# Altium footprint library KwantLib.PcbLib: 249 footprints (part 8 of 16)
Each footprint in its own frame and in the unit in brackets; x right, y up, seen from the top. Pads: shape width x height; smd on the part's side, far side on the other; paste and mask are expansions set on the pad; w line width, h text height; cw(c..) or ccw(c..) is an arc to the next point about the centre after c.
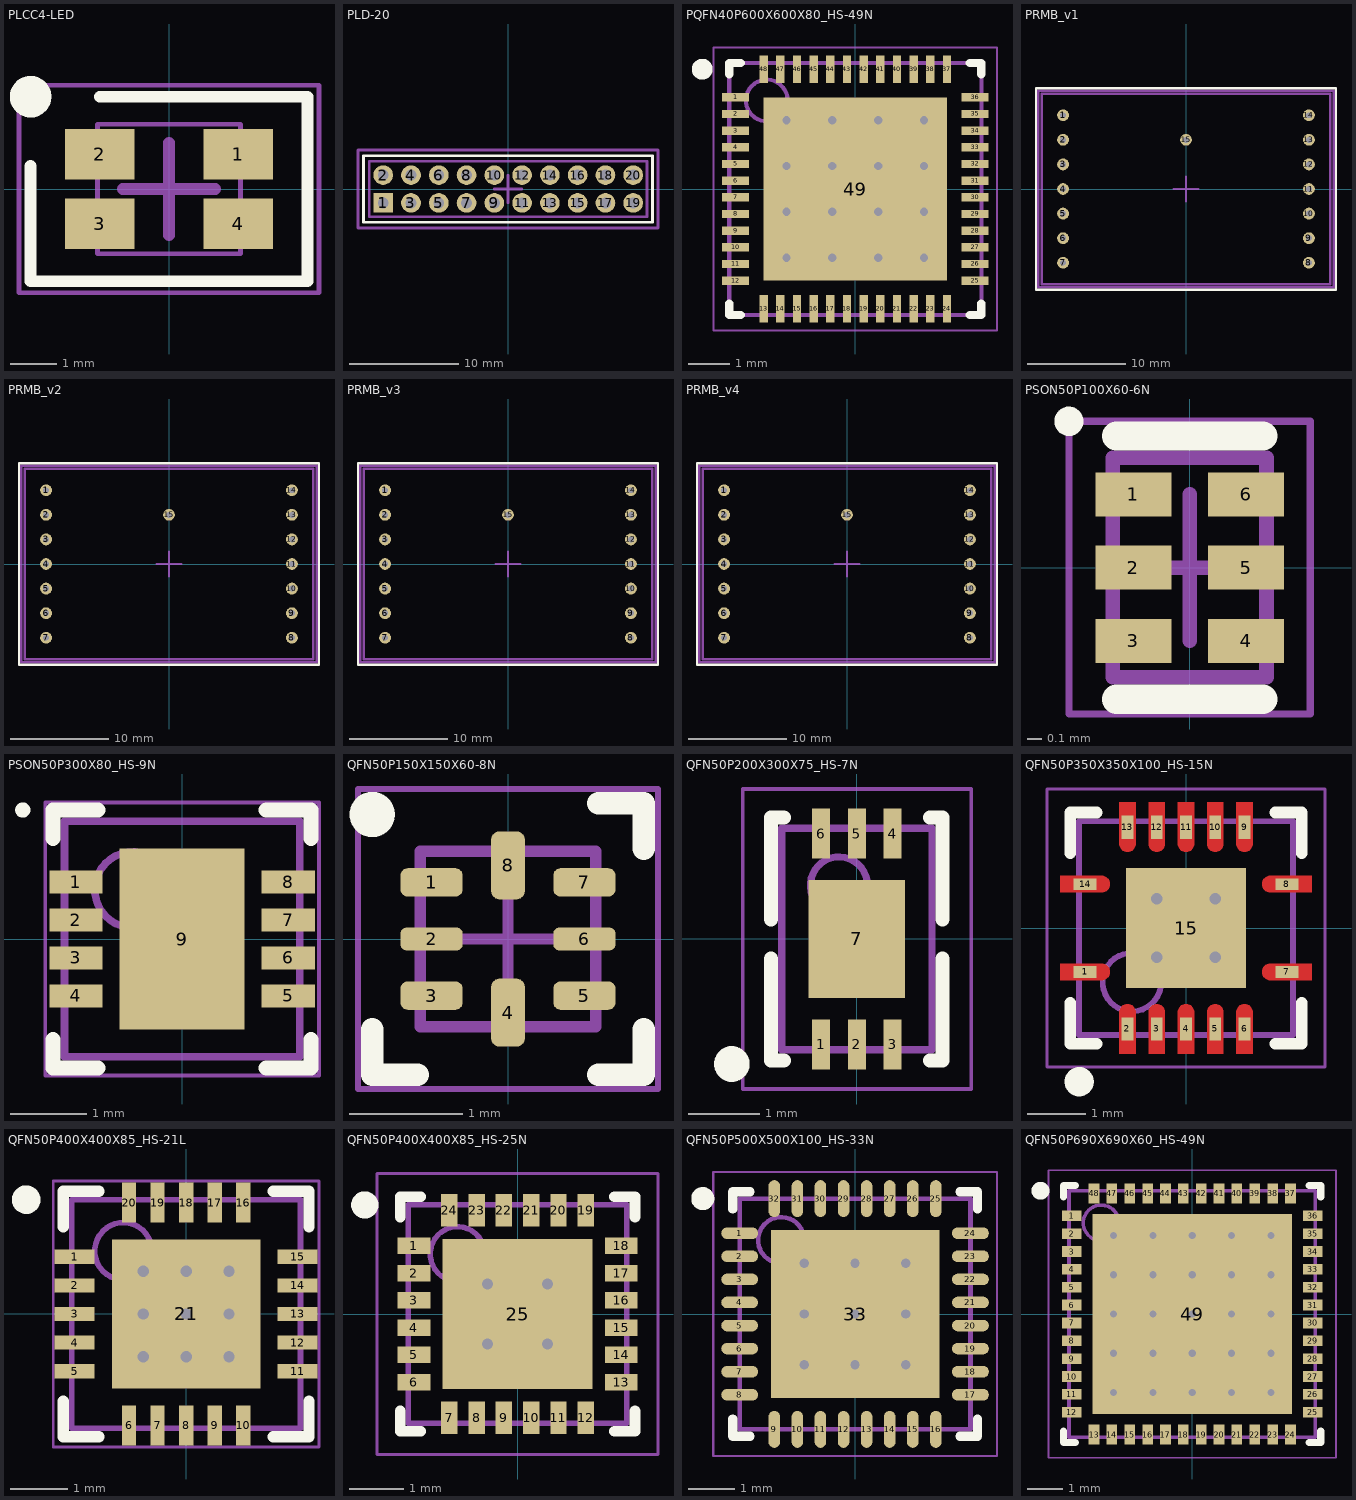
[diagram p7: the footprints below, top view; thin cyan lines are the x and y axes]

## PLCC4-LED [mm]
height 2
pads (4):
  rect 1.5x1.09 smd: 1(1.5,0.75) 2(-1.5,0.75) 3(-1.5,-0.75) 4(1.5,-0.75)
Top Overlay:
  circle w0.5: c-3,2 r0.2
  lines w0.254: -3,0.5 -3,-2 3,-2 3,2 -1.5,2
Mechanical 13:
  lines w0.1: -1.55,-1.4 1.55,-1.4 1.55,1.4 -1.55,1.4 -1.55,-1.4
Mechanical 15:
  lines w0.1: -3.25,-2.25 3.25,-2.25 3.25,2.25 -3.25,2.25 -3.25,-2.25
  lines w0.254: -1,0 1,0 ; 0,-1 0,1
3D body: height 2, standoff 0.01, extent -1.55,-1.4 1.55,1.4

## PLD-20 [mm]
height 8.5
pads (20):
  rect 1.8x1.8 hole 1: 1(-11.41,-1.27)
  round 1.8 hole 1: 2(-11.41,1.27) 3(-8.87,-1.27) 4(-8.87,1.27) 5(-6.33,-1.27) 6(-6.33,1.27) 7(-3.79,-1.27) 8(-3.79,1.27) 9(-1.25,-1.27) 10(-1.25,1.27) 11(1.29,-1.27) 12(1.29,1.27) 13(3.83,-1.27) 14(3.83,1.27) 15(6.37,-1.27) 16(6.37,1.27) 17(8.91,-1.27) 18(8.91,1.27) 19(11.45,-1.27) 20(11.45,1.27)
Top Overlay:
  lines w0.25: -13.208,-3.048 13.208,-3.048 13.208,3.048 -13.208,3.048 -13.208,-3.048
Mechanical 13:
  lines w0.25: -12.68,-2.54 12.72,-2.54 12.72,2.54 -12.68,2.54 -12.68,-2.54
Mechanical 15:
  lines w0.25: -1.25,0 1.25,0 ; 0,-1.25 0,1.25 ; -13.716,-3.556 13.716,-3.556 13.716,3.556 -13.716,3.556 -13.716,-3.556
3D body "PLD-2x10.stp": height 8.01, standoff -2.99, extent -12.68,-2.54 12.72,2.54

## PQFN40P600X600X80_HS-49N [mm] "PQFN, 48-Leads, Body 6.00x6.00mm, Pitch 0.40mm, Thermal Pad 4.40x4.40mm, IPC Medium Density"
height 0.8
pads (49):
  rect 0.65x0.2 smd paste-0.02 mask+0.07: 1(-2.875,2.2) 2(-2.875,1.8) 3(-2.875,1.4) 4(-2.875,1) 5(-2.875,0.6) 6(-2.875,0.2) 7(-2.875,-0.2) 8(-2.875,-0.6) 9(-2.875,-1) 10(-2.875,-1.4) 11(-2.875,-1.8) 12(-2.875,-2.2) 25(2.875,-2.2) 26(2.875,-1.8) 27(2.875,-1.4) 28(2.875,-1) 29(2.875,-0.6) 30(2.875,-0.2) 31(2.875,0.2) 32(2.875,0.6) 33(2.875,1) 34(2.875,1.4) 35(2.875,1.8) 36(2.875,2.2)
  rect 0.2x0.65 smd paste-0.02 mask+0.07: 13(-2.2,-2.875) 14(-1.8,-2.875) 15(-1.4,-2.875) 16(-1,-2.875) 17(-0.6,-2.875) 18(-0.2,-2.875) 19(0.2,-2.875) 20(0.6,-2.875) 21(1,-2.875) 22(1.4,-2.875) 23(1.8,-2.875) 24(2.2,-2.875) 37(2.2,2.875) 38(1.8,2.875) 39(1.4,2.875) 40(1,2.875) 41(0.6,2.875) 42(0.2,2.875) 43(-0.2,2.875) 44(-0.6,2.875) 45(-1,2.875) 46(-1.4,2.875) 47(-1.8,2.875) 48(-2.2,2.875)
  rect 4.4x4.4 smd paste-4 mask+0.07: 49(0,0)
via -1.65,1.65 diameter 0.5 hole 0.2
via -0.55,1.65 diameter 0.5 hole 0.2
via 0.55,1.65 diameter 0.5 hole 0.2
via 1.65,1.65 diameter 0.5 hole 0.2
via -1.65,0.55 diameter 0.5 hole 0.2
via -0.55,0.55 diameter 0.5 hole 0.2
via 0.55,0.55 diameter 0.5 hole 0.2
via 1.65,0.55 diameter 0.5 hole 0.2
via -1.65,-0.55 diameter 0.5 hole 0.2
via -0.55,-0.55 diameter 0.5 hole 0.2
via 0.55,-0.55 diameter 0.5 hole 0.2
via 1.65,-0.55 diameter 0.5 hole 0.2
via -1.65,-1.65 diameter 0.5 hole 0.2
via -0.55,-1.65 diameter 0.5 hole 0.2
via 0.55,-1.65 diameter 0.5 hole 0.2
via 1.65,-1.65 diameter 0.5 hole 0.2
Top Overlay:
  circle w0.25: c-3.675,2.875 r0.125
  lines w0.2: -3.025,-2.75 -3.025,-3.025 -2.75,-3.025 ; -3.025,2.75 -3.025,3.025 -2.75,3.025 ; 2.75,-3.025 3.025,-3.025 3.025,-2.75 ; 2.75,3.025 3.025,3.025 3.025,2.75
Top Paste:
  region: -2.025,-2.025 -2.025,-0.175 -0.175,-0.175 -0.175,-2.025
  region: 0.175,-2.025 0.175,-0.175 2.025,-0.175 2.025,-2.025
  region: 0.175,0.175 0.175,2.025 2.025,2.025 2.025,0.175
  region: -2.025,0.175 -2.025,2.025 -0.175,2.025 -0.175,0.175
Mechanical 13:
  circle w0.1: c-2.125,2.125 r0.5
  lines w0.1: -3.025,-3.025 -3.025,3.025 3.025,3.025 3.025,-3.025 -3.025,-3.025
Mechanical 15:
  lines w0.05: -3.4,-3.4 -3.4,3.4 3.4,3.4 3.4,-3.4 -3.4,-3.4
  lines w0.1: -0.5,0 0.5,0 ; 0,-0.5 0,0.5
3D body "PQFN40P600X600X80_HS-49N.step": height 0.8, standoff 0, extent -3.025,-3.025 3.025,3.025

## PRMB_v1 [mm] "Корпус УЗС Тестовый"
pads (15):
  round 1.2 hole 0.6: 1(-12.5,7.5) 2(-12.5,5) 3(-12.5,2.5) 4(-12.5,0) 5(-12.5,-2.5) 6(-12.5,-5) 7(-12.5,-7.5) 8(12.5,-7.5) 9(12.5,-5) 10(12.5,-2.5) 11(12.5,0) 12(12.5,2.5) 13(12.5,5) 14(12.5,7.5) 15(0,5)
Top Overlay:
  lines w0.254: -15.25,-10.25 -15.25,10.25 15.25,10.25 15.25,-10.25 -15.25,-10.25
Mechanical 13:
  lines w0.254: -14.675,-9.675 14.675,-9.675 14.675,9.675 -14.675,9.675 -14.675,-9.675
Mechanical 15:
  lines w0.254: -1.25,0 1.25,0 ; 0,-1.25 0,1.25 ; -15,-10 15,-10 15,10 -15,10 -15,-10
3D body "MWTestPrmb_v1.step": height 11.84, standoff -2.32, extent -14.675,-9.675 14.675,9.675

## PRMB_v2 [mm] "Корпус УЗС Тестовый"
pads (15):
  round 1.2 hole 0.6: 1(-12.5,7.5) 2(-12.5,5) 3(-12.5,2.5) 4(-12.5,0) 5(-12.5,-2.5) 6(-12.5,-5) 7(-12.5,-7.5) 8(12.5,-7.5) 9(12.5,-5) 10(12.5,-2.5) 11(12.5,0) 12(12.5,2.5) 13(12.5,5) 14(12.5,7.5) 15(0,5)
Top Overlay:
  lines w0.254: -15.25,-10.25 15.25,-10.25 15.25,10.25 -15.25,10.25 -15.25,-10.25
Mechanical 13:
  lines w0.254: -14.675,-9.675 -14.675,9.675 14.675,9.675 14.675,-9.675 -14.675,-9.675
Mechanical 15:
  lines w0.254: -1.25,0 1.25,0 ; 0,-1.25 0,1.25 ; -15,-10 -15,10 15,10 15,-10 -15,-10
3D body "MWTestPrmb_v2.step": height 11.84, standoff -2.32, extent -14.675,-9.675 14.675,9.675

## PRMB_v3 [mm] "Корпус УЗС Тестовый"
pads (15):
  round 1.2 hole 0.6: 1(-12.5,7.5) 2(-12.5,5) 3(-12.5,2.5) 4(-12.5,0) 5(-12.5,-2.5) 6(-12.5,-5) 7(-12.5,-7.5) 8(12.5,-7.5) 9(12.5,-5) 10(12.5,-2.5) 11(12.5,0) 12(12.5,2.5) 13(12.5,5) 14(12.5,7.5) 15(0,5)
Top Overlay:
  lines w0.254: -15.25,-10.25 -15.25,10.25 15.25,10.25 15.25,-10.25 -15.25,-10.25
Mechanical 13:
  lines w0.254: -14.675,-9.675 14.675,-9.675 14.675,9.675 -14.675,9.675 -14.675,-9.675
Mechanical 15:
  lines w0.254: -1.25,0 1.25,0 ; 0,-1.25 0,1.25 ; -15,-10 15,-10 15,10 -15,10 -15,-10
3D body "MWTestPrmb_v3.step": height 3.28, standoff -2.32, extent -14.675,-9.675 14.675,9.675

## PRMB_v4 [mm] "Корпус УЗС Тестовый"
pads (15):
  round 1.2 hole 0.6: 1(-12.5,7.5) 2(-12.5,5) 3(-12.5,2.5) 4(-12.5,0) 5(-12.5,-2.5) 6(-12.5,-5) 7(-12.5,-7.5) 8(12.5,-7.5) 9(12.5,-5) 10(12.5,-2.5) 11(12.5,0) 12(12.5,2.5) 13(12.5,5) 14(12.5,7.5) 15(0,5)
Top Overlay:
  lines w0.254: -15.25,-10.25 15.25,-10.25 15.25,10.25 -15.25,10.25 -15.25,-10.25
Mechanical 13:
  lines w0.254: -14.675,-9.675 -14.675,9.675 14.675,9.675 14.675,-9.675 -14.675,-9.675
Mechanical 15:
  lines w0.254: -1.25,0 1.25,0 ; 0,-1.25 0,1.25 ; -15,-10 -15,10 15,10 15,-10 -15,-10
3D body "MWTestPrmb_v4.step": height 3.28, standoff -2.32, extent -14.675,-9.675 14.675,9.675

## PSON50P100X60-6N [mm] "PSON, 6-Leads, Body 1.45x1.00mm, Pitch 0.50mm, IPC Medium Density"
height 0.6
pads (6):
  rect 0.52x0.3 smd paste-1 mask+0.07: 1(-0.385,0.5) 2(-0.385,0) 3(-0.385,-0.5) 4(0.385,-0.5) 5(0.385,0) 6(0.385,0.5)
Top Overlay:
  circle w0.1: c-0.825,1 r0.05
  lines w0.2: -0.5,-0.9 0.5,-0.9 ; -0.5,0.9 0.5,0.9
Top Paste:
  region: -0.66,-0.125 -0.66,0.125 -0.185,0.125 -0.185,-0.125
  region: -0.66,-0.625 -0.66,-0.375 -0.185,-0.375 -0.185,-0.625
  region: -0.66,0.375 -0.66,0.625 -0.185,0.625 -0.185,0.375
  region: 0.66,0.625 0.66,0.375 0.185,0.375 0.185,0.625
  region: 0.66,0.125 0.66,-0.125 0.185,-0.125 0.185,0.125
  region: 0.66,-0.375 0.66,-0.625 0.185,-0.625 0.185,-0.375
  lines w0.01: -0.66,-0.625 -0.185,-0.625 -0.185,-0.375 -0.66,-0.375 -0.66,-0.625 ; -0.66,-0.125 -0.66,0.125 -0.185,0.125 -0.185,-0.125 -0.66,-0.125 ; -0.66,0.375 -0.185,0.375 -0.185,0.625 -0.66,0.625 -0.66,0.375 ; 0.185,-0.625 0.66,-0.625 0.66,-0.375 0.185,-0.375 0.185,-0.625 ; 0.185,-0.125 0.66,-0.125 0.66,0.125 0.185,0.125 0.185,-0.125 ; 0.185,0.375 0.66,0.375 0.66,0.625 0.185,0.625 0.185,0.375
Mechanical 13:
  lines w0.1: -0.525,-0.75 0.525,-0.75 0.525,0.75 -0.525,0.75 -0.525,-0.75
Mechanical 15:
  lines w0.05: -0.825,-1 0.825,-1 0.825,1 -0.825,1 -0.825,-1
  lines w0.1: -0.5,0 0.5,0 ; 0,-0.5 0,0.5
3D body "PSON50P100X60-6N.step": height 0.6, standoff 0, extent -0.526,-0.75 0.526,0.75

## PSON50P300X80_HS-9N [mm] "PSON, 8-Leads, Body 3.00x3.00mm, Pitch 0.50mm, Thermal Pad 2.38x1.62mm, IPC Medium Density"
height 0.8
pads (9):
  rect 0.7x0.3 smd paste-0.04 mask+0.07: 1(-1.4,0.75) 2(-1.4,0.25) 3(-1.4,-0.25) 4(-1.4,-0.75) 5(1.4,-0.75) 6(1.4,-0.25) 7(1.4,0.25) 8(1.4,0.75)
  rect 1.65x2.38 smd paste-1 mask+0.07: 9(0,0)
Top Overlay:
  circle w0.1: c-2.1,1.7 r0.05
  lines w0.2: -1.7,-1.325 -1.7,-1.7 -1.11,-1.7 ; -1.7,1.325 -1.7,1.7 -1.11,1.7 ; 1.11,-1.7 1.7,-1.7 1.7,-1.325 ; 1.11,1.7 1.7,1.7 1.7,1.325
Top Paste:
  region: -0.75,-1.045 0.75,-1.045 0.75,-0.145 -0.75,-0.145
  region: -0.75,0.145 -0.75,1.045 0.75,1.045 0.75,0.145
Mechanical 13:
  circle w0.1: c-0.65,0.65 r0.5
  lines w0.1: -1.55,-1.55 1.55,-1.55 1.55,1.55 -1.55,1.55 -1.55,-1.55
Mechanical 15:
  lines w0.05: -1.805,-1.8 1.805,-1.8 1.805,1.8 -1.805,1.8 -1.805,-1.8
  lines w0.1: -0.5,0 0.5,0 ; 0,-0.5 0,0.5
3D body "PSON50P300X80_HS-9N.step": height 0.8, standoff 0, extent -1.551,-1.55 1.551,1.55

## QFN50P150X150X60-8N [mm] "QFN, 8-Leads, Body 1.50x1.50mm, Pitch 0.50mm, IPC Medium Density"
height 0.6
pads (8):
  rrect50% 0.55x0.25 smd paste-0.02 mask+0.07: 1(-0.675,0.5) 3(-0.675,-0.5) 5(0.675,-0.5) 7(0.675,0.5)
  rrect50% 0.55x0.2 smd paste-0.02 mask+0.07: 2(-0.675,0) 6(0.675,0)
  rrect50% 0.3x0.6 smd paste-0.02 mask+0.07: 4(0,-0.65) 8(0,0.65)
Top Overlay:
  circle w0.2: c-1.2,1.1 r0.1
  lines w0.2: -1.2,-0.8 -1.2,-1.2 -0.8,-1.2 ; 0.8,-1.2 1.2,-1.2 1.2,-0.8 ; 0.8,1.2 1.2,1.2 1.2,0.8
Mechanical 13:
  lines w0.1: -0.775,-0.775 -0.775,0.775 0.775,0.775 0.775,-0.775 -0.775,-0.775
Mechanical 15:
  lines w0.05: -1.325,-1.325 -1.325,1.325 1.325,1.325 1.325,-1.325 -1.325,-1.325
  lines w0.1: -0.5,0 0.5,0 ; 0,-0.5 0,0.5
3D body "QFN50P150X150X60-8N.step": height 0.6, standoff 0, extent -0.795,-0.795 0.795,0.795

## QFN50P200X300X75_HS-7N [mm] "QFN, 6-Leads, Body 2.00x3.00mm, Pitch 0.50mm, Thermal Pad 1.35x1.65mm, IPC Medium Density"
height 0.75
pads (7):
  rect 0.25x0.7 smd paste-1 mask+0.075: 1(-0.5,-1.475) 2(0,-1.475) 3(0.5,-1.475) 4(0.5,1.475) 5(0,1.475) 6(-0.5,1.475)
  rect 1.35x1.65 smd paste-1 mask+0.075: 7(0,0)
Top Overlay:
  circle w0.25: c-1.75,-1.75 r0.125
  lines w0.2: -1.2,-0.275 -1.2,-1.7 -1.025,-1.7 ; -1.2,0.275 -1.2,1.7 -1.025,1.7 ; 1.025,-1.7 1.2,-1.7 1.2,-0.275 ; 1.025,1.7 1.2,1.7 1.2,0.275
Top Paste:
  region: -0.576,1.17 -0.424,1.17 -0.424,1.78 -0.576,1.78
  region: -0.076,1.17 0.076,1.17 0.076,1.78 -0.076,1.78
  region: 0.424,1.17 0.576,1.17 0.576,1.78 0.424,1.78
  region: 0.424,-1.78 0.576,-1.78 0.576,-1.17 0.424,-1.17
  region: -0.076,-1.78 0.076,-1.78 0.076,-1.17 -0.076,-1.17
  region: -0.576,-1.78 -0.424,-1.78 -0.424,-1.17 -0.576,-1.17
  region: -0.6,-0.75 -0.6,0.75 0.6,0.75 0.6,-0.75
  lines w0.05: -0.6,-0.75 0.6,-0.75 0.6,0.75 -0.6,0.75 -0.6,-0.75 ; -0.576,-1.78 -0.576,-1.17 -0.424,-1.17 -0.424,-1.78 -0.576,-1.78 ; -0.576,1.17 -0.424,1.17 -0.424,1.78 -0.576,1.78 -0.576,1.17 ; -0.076,-1.78 0.076,-1.78 0.076,-1.17 -0.076,-1.17 -0.076,-1.78 ; -0.076,1.17 0.076,1.17 0.076,1.78 -0.076,1.78 -0.076,1.17 ; 0.424,-1.78 0.576,-1.78 0.576,-1.17 0.424,-1.17 0.424,-1.78 ; 0.424,1.17 0.576,1.17 0.576,1.78 0.424,1.78 0.424,1.17
Mechanical 13:
  circle w0.1: c-0.25,0.75 r0.4
  lines w0.1: -1.05,-1.55 -1.05,1.55 1.05,1.55 1.05,-1.55 -1.05,-1.55
Mechanical 15:
  lines w0.05: -1.6,-2.1 -1.6,2.1 1.6,2.1 1.6,-2.1 -1.6,-2.1
  lines w0.1: -0.5,0 0.5,0 ; 0,-0.5 0,0.5
3D body "QFN50P200X300X75_HS-7N.step": height 0.75, standoff 0, extent -1.05,-1.57 1.05,1.57

## QFN50P350X350X100_HS-15N [mm] "QFN, 14-Leads, Body 3.50x3.50mm, Pitch 1.50mm/0.50mm, Thermal Pad 2.05x2.05mm, IPC Medium Density"
height 1
pads (15):
  rect 0.4x0.2 smd paste-1 mask+0: 1(-1.725,-0.75) 7(1.725,-0.75) 8(1.725,0.75) 14(-1.725,0.75)
  rect 0.2x0.4 smd paste-1 mask+0: 2(-1,-1.725) 3(-0.5,-1.725) 4(0,-1.725) 5(0.5,-1.725) 6(1,-1.725) 9(1,1.725) 10(0.5,1.725) 11(0,1.725) 12(-0.5,1.725) 13(-1,1.725)
  rect 2.05x2.05 smd paste-3 mask+0.07: 15(0,0)
via -0.5,0.5 diameter 0.5 hole 0.2
via 0.5,0.5 diameter 0.5 hole 0.2
via 0.5,-0.5 diameter 0.5 hole 0.2
via -0.5,-0.5 diameter 0.5 hole 0.2
Top Layer:
  region: -2.15,0.61 -1.44,0.61 -1.412,0.61 -1.361,0.631 -1.321,0.671 -1.3,0.722 -1.3,0.75 -1.3,0.778 -1.321,0.829 -1.361,0.869 -1.412,0.89 -1.44,0.89 -2.15,0.89
  region: -2.15,-0.89 -1.44,-0.89 -1.412,-0.89 -1.361,-0.869 -1.321,-0.829 -1.3,-0.778 -1.3,-0.75 -1.3,-0.722 -1.321,-0.671 -1.361,-0.631 -1.412,-0.61 -1.44,-0.61 -2.15,-0.61
  region: -0.86,-2.15 -0.86,-1.44 -0.86,-1.412 -0.881,-1.361 -0.921,-1.321 -0.972,-1.3 -1,-1.3 -1.028,-1.3 -1.079,-1.321 -1.119,-1.361 -1.14,-1.412 -1.14,-1.44 -1.14,-2.15
  region: -0.36,-2.15 -0.36,-1.44 -0.36,-1.412 -0.381,-1.361 -0.421,-1.321 -0.472,-1.3 -0.5,-1.3 -0.528,-1.3 -0.579,-1.321 -0.619,-1.361 -0.64,-1.412 -0.64,-1.44 -0.64,-2.15
  region: 0.14,-2.15 0.14,-1.44 0.14,-1.412 0.119,-1.361 0.079,-1.321 0.028,-1.3 0,-1.3 -0.028,-1.3 -0.079,-1.321 -0.119,-1.361 -0.14,-1.412 -0.14,-1.44 -0.14,-2.15
  region: 0.64,-2.15 0.64,-1.44 0.64,-1.412 0.619,-1.361 0.579,-1.321 0.528,-1.3 0.5,-1.3 0.472,-1.3 0.421,-1.321 0.381,-1.361 0.36,-1.412 0.36,-1.44 0.36,-2.15
  region: 1.14,-2.15 1.14,-1.44 1.14,-1.412 1.119,-1.361 1.079,-1.321 1.028,-1.3 1,-1.3 0.972,-1.3 0.921,-1.321 0.881,-1.361 0.86,-1.412 0.86,-1.44 0.86,-2.15
  region: 2.15,-0.61 1.44,-0.61 1.412,-0.61 1.361,-0.631 1.321,-0.671 1.3,-0.722 1.3,-0.75 1.3,-0.778 1.321,-0.829 1.361,-0.869 1.412,-0.89 1.44,-0.89 2.15,-0.89
  region: 2.15,0.89 1.44,0.89 1.412,0.89 1.361,0.869 1.321,0.829 1.3,0.778 1.3,0.75 1.3,0.722 1.321,0.671 1.361,0.631 1.412,0.61 1.44,0.61 2.15,0.61
  region: 0.86,2.15 0.86,1.44 0.86,1.412 0.881,1.361 0.921,1.321 0.972,1.3 1,1.3 1.028,1.3 1.079,1.321 1.119,1.361 1.14,1.412 1.14,1.44 1.14,2.15
  region: 0.36,2.15 0.36,1.44 0.36,1.412 0.381,1.361 0.421,1.321 0.472,1.3 0.5,1.3 0.528,1.3 0.579,1.321 0.619,1.361 0.64,1.412 0.64,1.44 0.64,2.15
  region: -0.14,2.15 -0.14,1.44 -0.14,1.412 -0.119,1.361 -0.079,1.321 -0.028,1.3 0,1.3 0.028,1.3 0.079,1.321 0.119,1.361 0.14,1.412 0.14,1.44 0.14,2.15
  region: -0.64,2.15 -0.64,1.44 -0.64,1.412 -0.619,1.361 -0.579,1.321 -0.528,1.3 -0.5,1.3 -0.472,1.3 -0.421,1.321 -0.381,1.361 -0.36,1.412 -0.36,1.44 -0.36,2.15
  region: -1.14,2.15 -1.14,1.44 -1.14,1.412 -1.119,1.361 -1.079,1.321 -1.028,1.3 -1,1.3 -0.972,1.3 -0.921,1.321 -0.881,1.361 -0.86,1.412 -0.86,1.44 -0.86,2.15
Top Overlay:
  circle w0.25: c-1.825,-2.625 r0.125
  lines w0.2: -1.975,-1.275 -1.975,-1.975 -1.525,-1.975 ; -1.975,1.275 -1.975,1.975 -1.525,1.975 ; 1.525,-1.975 1.975,-1.975 1.975,-1.275 ; 1.525,1.975 1.975,1.975 1.975,1.275
Top Paste:
  region: -0.97,0.15 -0.97,0.97 -0.15,0.97 -0.15,0.15
  region: 0.15,0.15 0.15,0.97 0.97,0.97 0.97,0.15
  region: -0.97,-0.97 -0.97,-0.15 -0.15,-0.15 -0.15,-0.97
  region: 0.15,-0.97 0.97,-0.97 0.97,-0.15 0.15,-0.15
Mechanical 13:
  circle w0.1: c-0.925,-0.925 r0.5
  lines w0.1: -1.825,-1.825 -1.825,1.825 1.825,1.825 1.825,-1.825 -1.825,-1.825
Mechanical 15:
  lines w0.05: -2.375,-2.375 -2.375,2.375 2.375,2.375 2.375,-2.375 -2.375,-2.375
  lines w0.1: -0.5,0 0.5,0 ; 0,-0.5 0,0.5
3D body "QFN50P350X350X100_HS-15N.step": height 1, standoff 0, extent -1.835,-1.835 1.835,1.835

## QFN50P400X400X85_HS-21L [mm] "QFN, 20-Leads, Body 4.00x4.00mm, Pitch 0.50mm, Thermal Pad 2.60x2.60mm, IPC High Density"
height 0.85
pads (21):
  rect 0.7x0.25 smd mask+0.07: 1(-1.95,1) 2(-1.95,0.5) 3(-1.95,0) 4(-1.95,-0.5) 5(-1.95,-1) 11(1.95,-1) 12(1.95,-0.5) 13(1.95,0) 14(1.95,0.5) 15(1.95,1)
  rect 0.25x0.7 smd mask+0.07: 6(-1,-1.95) 7(-0.5,-1.95) 8(0,-1.95) 9(0.5,-1.95) 10(1,-1.95) 16(1,1.95) 17(0.5,1.95) 18(0,1.95) 19(-0.5,1.95) 20(-1,1.95)
  rect 2.6x2.6 smd mask+0.07: 21(0,0)
via 0.75,0.75 diameter 0.4 hole 0.2
via 0,0.75 diameter 0.4 hole 0.2
via -0.75,0.75 diameter 0.4 hole 0.2
via -0.75,0 diameter 0.4 hole 0.2
via 0.75,0 diameter 0.4 hole 0.2
via 0.75,-0.75 diameter 0.4 hole 0.2
via 0,-0.75 diameter 0.4 hole 0.2
via -0.75,-0.75 diameter 0.4 hole 0.2
via 0,0 diameter 0.4 hole 0.2
Top Overlay:
  circle w0.25: c-2.8,2 r0.125
  lines w0.2: -2.15,-1.525 -2.15,-2.15 -1.525,-2.15 ; -2.15,1.525 -2.15,2.15 -1.525,2.15 ; 1.525,-2.15 2.15,-2.15 2.15,-1.525 ; 1.525,2.15 2.15,2.15 2.15,1.525
Mechanical 13:
  circle w0.1: c-1.1,1.1 r0.5
  lines w0.1: -2,-2 2,-2 2,2 -2,2 -2,-2
Mechanical 15:
  lines w0.05: -2.325,-2.325 2.325,-2.325 2.325,2.325 -2.325,2.325 -2.325,-2.325
  lines w0.1: -0.5,0 0.5,0 ; 0,-0.5 0,0.5
3D body "QFN50P400X400X85_HS-21L.step": height 0.85, standoff 0, extent -2.02,-2.02 2.02,2.02

## QFN50P400X400X85_HS-25N [mm] "QFN, 24-Leads, Body 4,00x4,00mm, Pitch 0,50mm, Thermal Pad 2,70x2,70mm, IPC Medium Density"
height 0.85
pads (25):
  rect 0.6x0.3 smd paste-0.03 mask+0.07: 1(-1.9,1.25) 2(-1.9,0.75) 3(-1.9,0.25) 4(-1.9,-0.25) 5(-1.9,-0.75) 6(-1.9,-1.25) 13(1.9,-1.25) 14(1.9,-0.75) 15(1.9,-0.25) 16(1.9,0.25) 17(1.9,0.75) 18(1.9,1.25)
  rect 0.3x0.6 smd paste-0.03 mask+0.07: 7(-1.25,-1.9) 8(-0.75,-1.9) 9(-0.25,-1.9) 10(0.25,-1.9) 11(0.75,-1.9) 12(1.25,-1.9) 19(1.25,1.9) 20(0.75,1.9) 21(0.25,1.9) 22(-0.25,1.9) 23(-0.75,1.9) 24(-1.25,1.9)
  rect 2.75x2.75 smd paste-2 mask+0.07: 25(0,0)
via 0.55,-0.55 diameter 0.5 hole 0.2
via -0.55,-0.55 diameter 0.5 hole 0.2
via 0.55,0.55 diameter 0.5 hole 0.2
via -0.55,0.55 diameter 0.5 hole 0.2
Top Overlay:
  circle w0.25: c-2.8,2 r0.125
  lines w0.2: -2.15,-1.775 -2.15,-2.15 -1.775,-2.15 ; -2.15,1.775 -2.15,2.15 -1.775,2.15 ; 1.775,-2.15 2.15,-2.15 2.15,-1.775 ; 1.775,2.15 2.15,2.15 2.15,1.775
Top Paste:
  region: -1.225,0.1 -1.225,1.225 -0.1,1.225 -0.1,0.1
  region: -1.225,-1.225 -1.225,-0.1 -0.1,-0.1 -0.1,-1.225
  region: 0.1,-1.225 0.1,-0.1 1.225,-0.1 1.225,-1.225
  region: 0.1,0.1 0.1,1.225 1.225,1.225 1.225,0.1
Mechanical 1:
  lines w0.1: -1.225,-1.225 -0.1,-1.225 -0.1,-0.1 -1.225,-0.1 -1.225,-1.225 ; -1.225,0.1 -0.1,0.1 -0.1,1.225 -1.225,1.225 -1.225,0.1 ; 0.1,-1.225 1.225,-1.225 1.225,-0.1 0.1,-0.1 0.1,-1.225 ; 0.1,0.1 1.225,0.1 1.225,1.225 0.1,1.225 0.1,0.1
Mechanical 13:
  circle w0.1: c-1.1,1.1 r0.5
  lines w0.1: -2,-2 2,-2 2,2 -2,2 -2,-2
Mechanical 15:
  lines w0.05: -2.575,-2.575 2.575,-2.575 2.575,2.575 -2.575,2.575 -2.575,-2.575
  lines w0.1: -0.5,0 0.5,0 ; 0,-0.5 0,0.5
3D body "QFN50P400X400X85_HS-25N.step": height 0.85, standoff 0, extent -2.01,-2.01 2.01,2.01

## QFN50P500X500X100_HS-33N [mm] "QFN, 32-Leads, Body 5.00x5.00mm, Pitch 0.50mm, Thermal Pad 3.65x3.65mm, IPC Medium Density"
height 1
pads (33):
  oval 0.8x0.25 smd paste-0.02 mask+0.07: 1(-2.5,1.75) 2(-2.5,1.25) 3(-2.5,0.75) 4(-2.5,0.25) 5(-2.5,-0.25) 6(-2.5,-0.75) 7(-2.5,-1.25) 8(-2.5,-1.75) 17(2.5,-1.75) 18(2.5,-1.25) 19(2.5,-0.75) 20(2.5,-0.25) 21(2.5,0.25) 22(2.5,0.75) 23(2.5,1.25) 24(2.5,1.75)
  oval 0.25x0.8 smd paste-0.02 mask+0.07: 9(-1.75,-2.5) 10(-1.25,-2.5) 11(-0.75,-2.5) 12(-0.25,-2.5) 13(0.25,-2.5) 14(0.75,-2.5) 15(1.25,-2.5) 16(1.75,-2.5) 25(1.75,2.5) 26(1.25,2.5) 27(0.75,2.5) 28(0.25,2.5) 29(-0.25,2.5) 30(-0.75,2.5) 31(-1.25,2.5) 32(-1.75,2.5)
  rect 3.65x3.65 smd paste-2 mask+0.07: 33(0,0)
via -1.1,1.1 diameter 0.5 hole 0.2
via 0,1.1 diameter 0.5 hole 0.2
via 1.1,1.1 diameter 0.5 hole 0.2
via -1.1,0 diameter 0.5 hole 0.2
via 1.1,0 diameter 0.5 hole 0.2
via -1.1,-1.1 diameter 0.5 hole 0.2
via 0,-1.1 diameter 0.5 hole 0.2
via 1.1,-1.1 diameter 0.5 hole 0.2
via 0,0 diameter 0.5 hole 0.2
Top Overlay:
  circle w0.25: c-3.3,2.5 r0.125
  lines w0.2: -2.65,-2.275 -2.65,-2.65 -2.275,-2.65 ; -2.65,2.275 -2.65,2.65 -2.275,2.65 ; 2.275,-2.65 2.65,-2.65 2.65,-2.275 ; 2.275,2.65 2.65,2.65 2.65,2.275
Top Paste:
  rectangle: -1.65,0.15 -0.15,1.65
  rectangle: -1.65,-1.65 -0.15,-0.15
  rectangle: 0.15,-1.65 1.65,-0.15
  rectangle: 0.15,0.15 1.65,1.65
Mechanical 13:
  circle w0.1: c-1.6,1.6 r0.5
  lines w0.1: -2.5,-2.5 -2.5,2.5 2.5,2.5 2.5,-2.5 -2.5,-2.5
Mechanical 15:
  lines w0.05: -3.075,-3.075 -3.075,3.075 3.075,3.075 3.075,-3.075 -3.075,-3.075
  lines w0.1: -0.5,0 0.5,0 ; 0,-0.5 0,0.5
3D body "QFN50P500X500X100_HS-33N.step": height 1, standoff 0, extent -2.51,-2.51 2.51,2.51

## QFN50P690X690X60_HS-49N [mm] "QFN, 48-Leads, Body 6.90x6.90mm, Pitch 0.50mm, Thermal Pad 5.60x5.60mm, IPC Medium Density"
height 0.6
pads (49):
  rect 0.55x0.3 smd mask+0.07: 1(-3.375,2.75) 2(-3.375,2.25) 3(-3.375,1.75) 4(-3.375,1.25) 5(-3.375,0.75) 6(-3.375,0.25) 7(-3.375,-0.25) 8(-3.375,-0.75) 9(-3.375,-1.25) 10(-3.375,-1.75) 11(-3.375,-2.25) 12(-3.375,-2.75) 25(3.375,-2.75) 26(3.375,-2.25) 27(3.375,-1.75) 28(3.375,-1.25) 29(3.375,-0.75) 30(3.375,-0.25) 31(3.375,0.25) 32(3.375,0.75) 33(3.375,1.25) 34(3.375,1.75) 35(3.375,2.25) 36(3.375,2.75)
  rect 0.3x0.55 smd mask+0.07: 13(-2.75,-3.375) 14(-2.25,-3.375) 15(-1.75,-3.375) 16(-1.25,-3.375) 17(-0.75,-3.375) 18(-0.25,-3.375) 19(0.25,-3.375) 20(0.75,-3.375) 21(1.25,-3.375) 22(1.75,-3.375) 23(2.25,-3.375) 24(2.75,-3.375) 37(2.75,3.375) 38(2.25,3.375) 39(1.75,3.375) 40(1.25,3.375) 41(0.75,3.375) 42(0.25,3.375) 43(-0.25,3.375) 44(-0.75,3.375) 45(-1.25,3.375) 46(-1.75,3.375) 47(-2.25,3.375) 48(-2.75,3.375)
  rect 5.6x5.6 smd mask+0.07: 49(0,0)
via 2.2,-2.2 diameter 0.5 hole 0.2
via 1.1,-2.2 diameter 0.5 hole 0.2
via 0,-2.2 diameter 0.5 hole 0.2
via -1.1,-2.2 diameter 0.5 hole 0.2
via -2.2,-2.2 diameter 0.5 hole 0.2
via 2.2,-1.1 diameter 0.5 hole 0.2
via 1.1,-1.1 diameter 0.5 hole 0.2
via 0,-1.1 diameter 0.5 hole 0.2
via -1.1,-1.1 diameter 0.5 hole 0.2
via -2.2,-1.1 diameter 0.5 hole 0.2
via 2.2,0 diameter 0.5 hole 0.2
via 1.1,0 diameter 0.5 hole 0.2
via 0,0 diameter 0.5 hole 0.2
via -1.1,0 diameter 0.5 hole 0.2
via -2.2,0 diameter 0.5 hole 0.2
via 2.2,1.1 diameter 0.5 hole 0.2
via 1.1,1.1 diameter 0.5 hole 0.2
via 0,1.1 diameter 0.5 hole 0.2
via -1.1,1.1 diameter 0.5 hole 0.2
via -2.2,1.1 diameter 0.5 hole 0.2
via 2.2,2.2 diameter 0.5 hole 0.2
via 1.1,2.2 diameter 0.5 hole 0.2
via 0,2.2 diameter 0.5 hole 0.2
via -1.1,2.2 diameter 0.5 hole 0.2
via -2.2,2.2 diameter 0.5 hole 0.2
Top Overlay:
  circle w0.25: c-4.25,3.45 r0.125
  lines w0.2: -3.6,-3.275 -3.6,-3.6 -3.275,-3.6 ; -3.6,3.275 -3.6,3.6 -3.275,3.6 ; 3.275,-3.6 3.6,-3.6 3.6,-3.275 ; 3.275,3.6 3.6,3.6 3.6,3.275
Mechanical 13:
  circle w0.1: c-2.55,2.55 r0.5
  lines w0.1: -3.45,-3.45 3.45,-3.45 3.45,3.45 -3.45,3.45 -3.45,-3.45
Mechanical 15:
  lines w0.05: -4.025,-4.025 4.025,-4.025 4.025,4.025 -4.025,4.025 -4.025,-4.025
  lines w0.1: -0.5,0 0.5,0 ; 0,-0.5 0,0.5
3D body "QFN50P690X690X60_HS-49N.step": height 0.6, standoff 0, extent -3.47,-3.47 3.47,3.47